# Altium footprint library Summer_Studio.PcbLib: 44 footprints (part 1 of 3)
Each footprint in its own frame and in the unit in brackets; x right, y up, seen from the top. Pads: shape width x height; smd on the part's side, far side on the other; paste and mask are expansions set on the pad; w line width, h text height; cw(c..) or ccw(c..) is an arc to the next point about the centre after c.
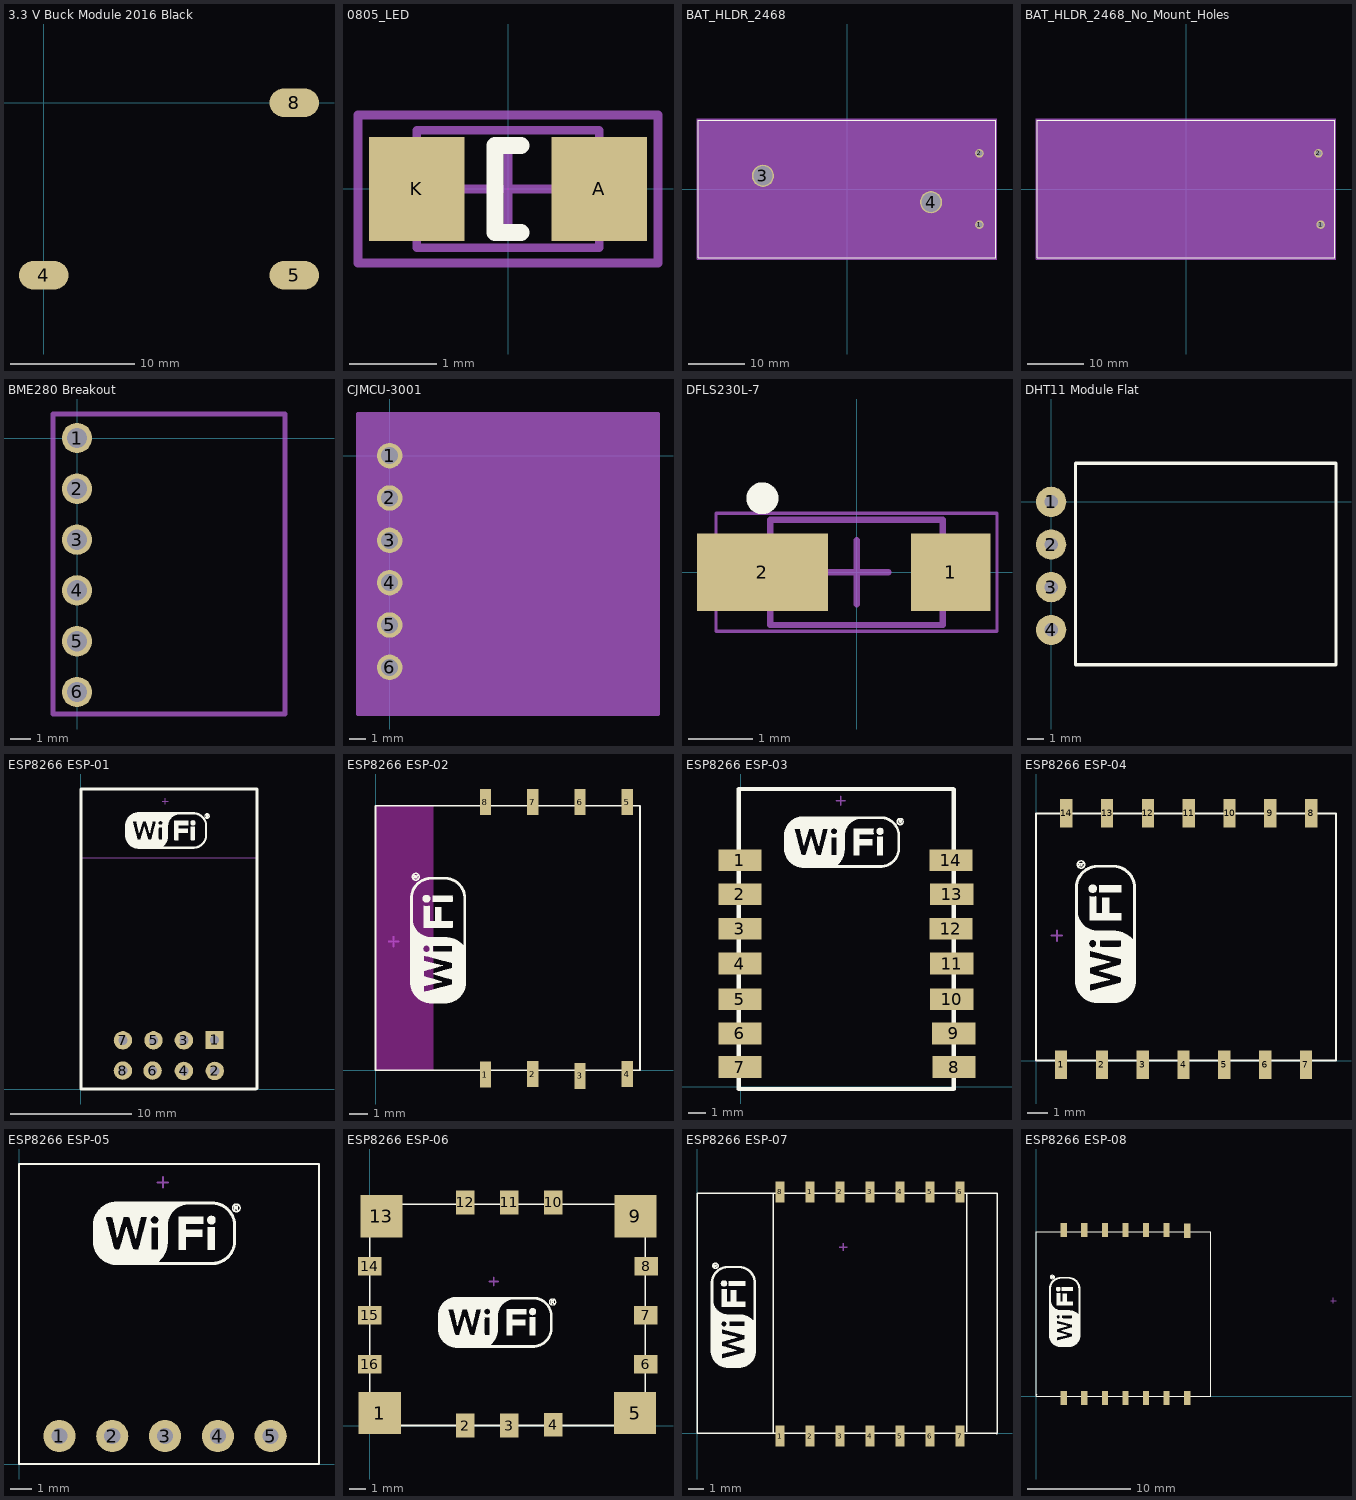
[diagram p0: the footprints below, top view; thin cyan lines are the x and y axes]

## 3.3 V Buck Module 2016 Black [mm]
height 4.2
pads (3):
  oval 4x2.3 smd: 4(0,-13.92) 5(20.22,-13.92) 8(20.22,0)

## 0805_LED [mm] "Chip LED, 2-Leads, Body 2.0x1.3mm, IPC Medium Density"
height 0.8
pads (2):
  rect 1.1x1.2 smd: A(1.05,0) K(-1.05,0)
Top Overlay:
  lines w0.2: 0.15,-0.5 -0.15,-0.5 -0.15,0.5 0.15,0.5
Mechanical 13:
  lines w0.1: -1.05,-0.675 1.05,-0.675 1.05,0.675 -1.05,0.675 -1.05,-0.675
Mechanical 15:
  lines w0.1: -0.5,0 0.5,0 ; 0,-0.5 0,0.5 ; -1.725,-0.85 1.725,-0.85 1.725,0.85 -1.725,0.85 -1.725,-0.85
3D body "WL-SMCW_0805_LED.stp": height 0.68, standoff -0.02, extent -1,-0.625 1,0.625

## BAT_HLDR_2468 [mil]
pads (4):
  round 60 hole 40: 1(930,-250) 2(930,250)
  round 156 hole 136: 3(-590,92.5) 4(590,-92.5)
Top Overlay:
  lines w6: -1043,-484 1043,-484 1043,484 -1043,484 -1043,-484
Mechanical 13:
  lines w1: -1043,-484 1043,-484 1043,484 -1043,484 -1043,-484
Mechanical 15:
  region: 1053,494 -1053,494 -1053,-494 1053,-494
  lines w6: -1053,-494 -1053,494 1053,494 1053,-494 -1053,-494
3D body: height 10, standoff 0, extent 0,0 10,10
3D body: height 10, standoff 0, extent 0,0 0,0
3D body "koszyk 2xAAA_214.STEP": height 514.91, standoff 3.1, extent -1038.95,-484.57 1039.92,480

## BAT_HLDR_2468_No_Mount_Holes [mil]
pads (2):
  round 60 hole 40: 1(944.88,-250) 2(930,250)
Top Overlay:
  lines w6: -1043,-484 1043,-484 1043,484 -1043,484 -1043,-484
Mechanical 13:
  lines w1: -1043,-484 1043,-484 1043,484 -1043,484 -1043,-484
Mechanical 15:
  region: 1053,494 -1053,494 -1053,-494 1053,-494
  lines w6: -1053,-494 -1053,494 1053,494 1053,-494 -1053,-494
3D body: height 10, standoff 0, extent 0,0 10,10
3D body: height 10, standoff 0, extent 0,0 0,0
3D body "koszyk 2xAAA_214.STEP": height 514.91, standoff 3.1, extent -1038.95,-484.57 1039.92,480

## BME280 Breakout [mil] "Aliexpress BME280 daughter board"
pads (6):
  round 60 hole 40.16: 1(0,0) 2(0,-100) 3(0,-200) 4(0,-300) 5(0,-400)
  round 60 hole 40.16 paste+0: 6(0,-500)
Mechanical 1:
  lines w10: -47.24,-543.31 409.45,-543.31 409.45,47.24 -47.24,47.24 -47.24,-543.31
3D body "P280, 6-PIN-Version v4.step": height 98.03, standoff -1.38, extent -59.05,-550.2 393.7,52.17

## CJMCU-3001 [mil] "CJMCU-3001 OPT3001 Ambient Light Sensor Module I2C Human Eye Measuring Light Intensity Luxmeter"
pads (6):
  round 60 hole 40.16: 1(0,0) 2(0,-100) 3(0,-200) 4(0,-300) 5(0,-400) 6(0,-500)
Mechanical 15:
  rectangle: -74.8,-610.24 633.86,98.43
  region: -74.8,-610.24 -74.8,98.43 633.86,98.43 633.86,-610.24
  lines w10: -74.8,-610.24 633.86,-610.24 633.86,98.43 -74.8,98.43 -74.8,-610.24
3D body: height 98.03, standoff -1.38, extent 196.85,-251.97 196.85,-251.97
3D body: height 98.03, standoff -1.38, extent 185.04,-224.41 185.04,-224.41
3D body: height 61.81, standoff -15.75, extent -74.8,-610.24 633.86,98.43

## DFLS230L-7 [mm] "SOD, 2-Leads, Body 2.7x1.65mm"
height 0.98
pads (2):
  rect 1.25x1.22 smd: 1(1.475,0)
  rect 2.05x1.22 smd: 2(-1.475,0)
Top Overlay:
  circle w0.25: c-1.475,1.16 r0.125
Mechanical 13:
  lines w0.1: -1.35,-0.825 1.35,-0.825 1.35,0.825 -1.35,0.825 -1.35,-0.825
Mechanical 15:
  lines w0.05: -2.2,-0.925 -2.2,0.925 2.2,0.925 2.2,-0.925 -2.2,-0.925
  lines w0.1: -0.5,0 0.5,0 ; 0,-0.5 0,0.5
3D body: height 0.98, standoff 0, extent -1.35,-0.825 1.35,0.825

## DHT11 Module Flat [mm]
pads (4):
  round 1.8 hole 0.8: 1(0,0) 2(0,-2.54) 3(0,-5.08) 4(0,-7.62)
Top Overlay:
  lines w0.2: 1.45,-9.7 16.95,-9.7 16.95,2.3 1.45,2.3 1.45,-9.7
3D body: height 5.5, standoff 0, extent 1.45,-9.7 16.95,2.3
3D body: height 1.6, standoff 0, extent 7.493,-7.747 7.493,-7.747
3D body: height 1.6, standoff 0, extent -1.524,1.651 -1.524,1.651

## ESP8266 ESP-01 [mil] "ESP8266 ESP-01"
pads (8):
  rect 60x60 hole 30: 1(436,161)
  round 60 hole 30: 2(437,60) 3(336,160) 4(336,60) 5(237,160) 6(234,61) 7(137,160) 8(137,61)
Top Overlay:
  drawing of 1265 lines, arcs and shapes, not listed
  text ".Designator" at -15,-37 h39.37
Mechanical 13:
  lines w2: 0.04,755.97 575,755.97
  text "ANTENNA AREA" at 10.04,958.59 h10
  text "CUTOUT POLYGON" at 10.04,938.59 h10
Mechanical 15:
  lines w3.94: 265,939.92 285,939.92 ; 275,929.92 275,949.92
3D body "User Library-Wi07C.STEP": height 231.4, standoff -228.35, extent 1.13,1.81 572,978.19

## ESP8266 ESP-02 [mm] "ESP8266 ESP-02"
pads (8):
  rect 0.6x1.4 smd: 1(5.893,-0.229) 2(8.433,-0.203) 3(10.973,-0.305) 4(13.513,-0.203) 5(13.513,14.402) 6(10.973,14.402) 7(8.433,14.402) 8(5.893,14.402)
Top Layer keep-out:
  region: 0,14.2 0.027,14.173 3.099,14.173 3.099,0.025 3.073,0 0,0
Top Overlay:
  drawing of 1264 lines, arcs and shapes, not listed
  text ".Designator" at 0,-0.965 h1
Mechanical 15:
  lines w0.1: 0.713,6.909 1.221,6.909 ; 0.967,6.655 0.967,7.163
3D body: height 0.5, standoff 0, extent 0,0 14.199,14.199
3D body: height 1, standoff 0.5, extent 4.826,3.454 9.144,7.95
3D body: height 1, standoff 0.5, extent 10.63,4.635 13.094,6.896

## ESP8266 ESP-03 [mil] "ESP8266 ESP-03"
pads (14):
  rect 100x50 smd: 1(-2,522) 2(-2,443.27) 3(-2,364) 4(-2,284) 5(-2,202) 6(-2,123) 7(-2,45.57) 8(491,45.57) 9(490,123) 10(486,202) 11(486,284) 12(484,364) 13(486,443.27) 14(484,522)
Top Overlay:
  drawing of 1265 lines, arcs and shapes, not listed
  text ".Designator" at -6,-48 h39.37
Mechanical 15:
  lines w3.94: 220,658.92 240,658.92 ; 230,648.92 230,668.92
3D body "User Library-ESP-03.STEP": height 134.34, standoff -1.09, extent -0.97,1 483.28,682.1

## ESP8266 ESP-04 [mm] "ESP8266 ESP-04"
pads (14):
  rect 0.6x1.4 smd: 1(1.229,-0.203) 2(3.229,-0.203) 3(5.229,-0.203) 4(7.229,-0.203) 5(9.229,-0.203) 6(11.229,-0.203) 7(13.229,-0.203) 8(13.483,12.116) 9(11.483,12.116) 10(9.483,12.116) 11(7.483,12.116) 12(5.483,12.116) 13(3.483,12.116) 14(1.483,12.116)
Top Overlay:
  drawing of 1264 lines, arcs and shapes, not listed
  text ".Designator" at -0.076,-1.956 h1
Mechanical 15:
  lines w0.1: 0.764,6.121 1.272,6.121 ; 1.018,5.867 1.018,6.375
3D body: height 1, standoff 0.5, extent 9.271,1.981 11.735,4.242
3D body: height 1, standoff 0.5, extent 3.683,1.956 8.001,6.452
3D body: height 0.5, standoff 0, extent 0,0 14.681,12.09

## ESP8266 ESP-05 [mil] "ESP8266 ESP-05"
pads (5):
  round 60 hole 30: 1(75.3,52) 2(173.72,52) 3(272.15,52) 4(370.57,52) 5(469,52)
Top Overlay:
  drawing of 1264 lines, arcs and shapes, not listed
  text ".Designator" at 1,-40 h39.37
Mechanical 15:
  lines w3.94: 258,524.92 278,524.92 ; 268,514.92 268,534.92
3D body: height 39.37, standoff 19.68, extent 325,138 422,227
3D body: height 39.37, standoff 19.68, extent 105,137 275,314
3D body: height 19.68, standoff 0, extent 0,1 559,559

## ESP8266 ESP-06 [mm] "ESP8266 ESP-06"
pads (16):
  rect 2.5x2.5 smd: 1(0.584,0.737) 5(15.697,0.737) 9(15.723,12.395) 13(0.686,12.395)
  rect 1.1x1.4 smd: 2(5.648,0) 3(8.248,0) 4(10.848,0.051) 10(10.848,13.208) 11(8.248,13.208) 12(5.648,13.208)
  rect 1.4x1.1 smd: 6(16.332,3.642) 7(16.332,6.542) 8(16.358,9.442) 14(0,9.442) 15(0,6.542) 16(0,3.642)
Top Overlay:
  drawing of 1264 lines, arcs and shapes, not listed
  text ".Designator" at -0.686,-1.651 h1
Mechanical 15:
  lines w0.1: 7.087,8.532 7.595,8.532 ; 7.341,8.278 7.341,8.786
3D body: height 1, standoff 0.5, extent 9.322,3.241 11.786,5.501
3D body: height 1, standoff 0.5, extent 3.734,3.215 8.052,7.711
3D body: height 0.5, standoff 0, extent 0,0 16.281,13.081

## ESP8266 ESP-07 [mm] "ESP8266 ESP-01"
pads (14):
  rect 0.6x1.4 smd: 1(5.533,-0.178) 1(7.533,16.104) 2(7.533,-0.178) 2(9.533,16.104) 3(9.533,-0.178) 3(11.533,16.104) 4(11.533,-0.178) 4(13.533,16.104) 5(13.533,-0.178) 5(15.533,16.104) 6(15.533,-0.178) 6(17.533,16.104) 7(17.533,-0.178) 8(5.533,16.104)
Top Overlay:
  drawing of 1267 lines, arcs and shapes, not listed
  text ".Designator" at 0,-1.702 h1
Mechanical 15:
  lines w0.1: 9.5,12.419 10.008,12.419 ; 9.754,12.165 9.754,12.673
3D body: height 1, standoff 0.5, extent 13.36,2.591 15.824,4.851
3D body: height 1, standoff 0.5, extent 7.772,2.565 12.09,7.061
3D body: height 0.5, standoff 0, extent 0,0 20.041,16.002

## ESP8266 ESP-08 [mm] "ESP8266 ESP-08"
pads (14):
  rect 0.6x1.4 smd: 1(2.695,-0.178) 2(4.695,-0.178) 3(6.695,-0.178) 4(8.695,-0.178) 5(10.695,-0.178) 6(12.695,-0.178) 7(14.695,-0.178) 8(14.695,16.078) 9(12.695,16.154) 10(10.695,16.154) 11(8.695,16.154) 12(6.695,16.154) 13(4.695,16.154) 14(2.695,16.154)
Top Overlay:
  drawing of 1265 lines, arcs and shapes, not listed
  text ".Designator" at -0.229,-1.499 h1
Mechanical 15:
  lines w0.1: 28.651,9.294 29.159,9.294 ; 28.905,9.04 28.905,9.548
3D body: height 1, standoff 0.5, extent 10.338,2.591 12.802,4.851
3D body: height 1, standoff 0.5, extent 4.75,2.565 9.068,7.061
3D body: height 0.5, standoff 0, extent 0,0 17.018,16.002